# Altium footprint library MC1.PcbLib: 70 footprints (part 3 of 5)
Each footprint in its own frame and in the unit in brackets; x right, y up, seen from the top. Pads: shape width x height; smd on the part's side, far side on the other; paste and mask are expansions set on the pad; w line width, h text height; cw(c..) or ccw(c..) is an arc to the next point about the centre after c.
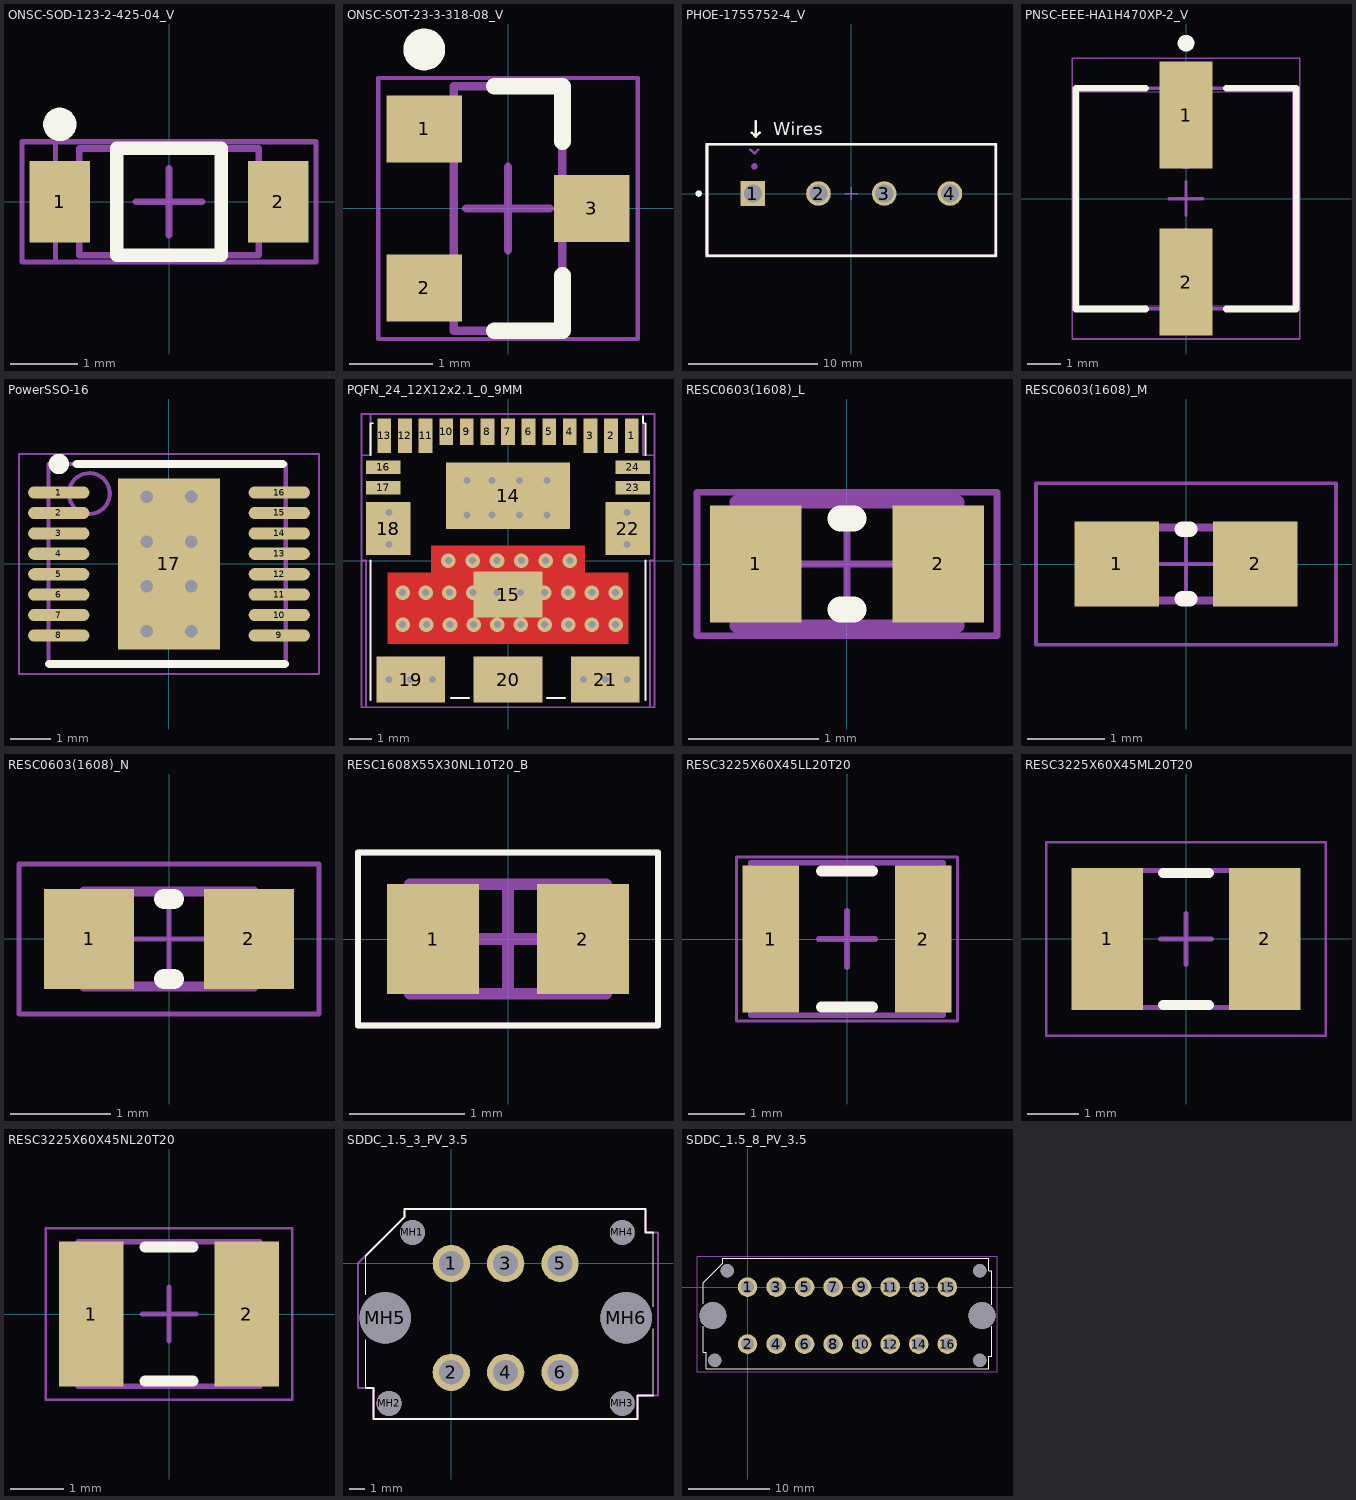
[diagram p2: the footprints below, top view; thin cyan lines are the x and y axes]

## ONSC-SOD-123-2-425-04_V [mm] "SOD, 2-Leads, Body 2.69x1.6mm"
height 1.35
pads (2):
  rect 0.91x1.22 smd: 1(-1.635,0) 2(1.635,0)
Top Overlay:
  circle w0.25: c-1.635,1.16 r0.125
  lines w0.2: -0.78,-0.8 0.78,-0.8 0.78,0.8 -0.78,0.8 -0.78,-0.8
Top Courtyard:
  lines w0.05: -2.19,-0.9 2.19,-0.9 2.19,0.9 -2.19,0.9 -2.19,-0.9
  lines w0.1: -0.5,0 0.5,0 ; 0,-0.5 0,0.5
Mechanical 13:
  lines w0.1: -1.345,-0.8 1.345,-0.8 1.345,0.8 -1.345,0.8 -1.345,-0.8
Mechanical 15:
  lines w0.05: -2.19,-0.9 2.19,-0.9 2.19,0.9 -2.19,0.9 -2.19,-0.9
  lines w0.1: -0.5,0 0.5,0 ; 0,-0.5 0,0.5
Top Assembly (Mech29):
  lines w0.076: -1.7,0.9 -1.7,-0.9 -2.2,-0.9 ; -2.2,-0.9 -2.2,0.9 2.2,0.9 2.2,-0.9 -2.2,-0.9
  text "'.Designator'" at -2.878,-0.212 h0.51
3D body: height 1.35, standoff 0, extent -1.345,-0.8 1.345,0.8

## ONSC-SOT-23-3-318-08_V [mm] "SOT23, 3-Leads, Body 2.92x1.3mm, Pitch 0.95mm"
height 1.11
pads (3):
  rect 0.9x0.8 smd: 1(-1,0.95) 2(-1,-0.95) 3(1,0)
Top Overlay:
  circle w0.25: c-1,1.9 r0.125
  lines w0.2: -0.165,-1.46 0.65,-1.46 0.65,-0.8 ; -0.165,1.46 0.65,1.46 0.65,0.8
Top Courtyard:
  lines w0.05: -1.55,-1.56 -1.55,1.56 1.55,1.56 1.55,-1.56 -1.55,-1.56
  lines w0.1: -0.5,0 0.5,0 ; 0,-0.5 0,0.5
Mechanical 13:
  lines w0.1: -0.65,-1.46 -0.65,1.46 0.65,1.46 0.65,-1.46 -0.65,-1.46
Mechanical 15:
  lines w0.05: -1.55,-1.56 -1.55,1.56 1.55,1.56 1.55,-1.56 -1.55,-1.56
  lines w0.1: -0.5,0 0.5,0 ; 0,-0.5 0,0.5
Top Assembly (Mech29):
  circle w0.254: c-1,1 r0.141
  lines w0.05: -1.55,-1.56 -1.55,1.56 1.55,1.56 1.55,-1.56 -1.55,-1.56
  text "'.Designator'" at -0.212,2.878 h0.51
3D body: height 1.11, standoff 0.01, extent -0.65,-1.46 0.65,1.46

## PHOE-1755752-4_V [mm] "TH, 4-Leads, Body 21.32x8.6mm, Pitch 5.08mm"
height 12
pads (4):
  rect 1.9x1.9 hole 1.4: 1(-7.62,0)
  round 1.9 hole 1.4: 2(-2.54,0) 3(2.54,0) 4(7.62,0)
Top Overlay:
  circle w0.25: c-11.81,0 r0.125
  lines w0.2: -7.7,4.7 -7.4,4.4 ; -7.4,5.6 -7.4,4.4 ; -7.1,4.7 -7.4,4.4 ; -11.16,-4.8 11.16,-4.8 11.16,3.8 -11.16,3.8 -11.16,-4.8
  text "Wires" at -6.049,4.5 h1
Mechanical 13:
  lines w0.1: -11.16,-4.8 11.16,-4.8 11.16,3.8 -11.16,3.8 -11.16,-4.8
Mechanical 15:
  lines w0.05: -11.26,-4.9 11.26,-4.9 11.26,3.9 -11.26,3.9 -11.26,-4.9
  lines w0.1: -0.5,0 0.5,0 ; 0,-0.5 0,0.5
Top Assembly (Mech29):
  circle w0.25: c-7.5,2.1 r0.125
  lines w0.2: -7.8,3.4 -7.5,3.1 -7.2,3.4 ; -11.16,-4.8 11.16,-4.8 11.16,3.8 -11.16,3.8 -11.16,-4.8
  text "'.Designator'" at -5.665,-0.417 h1
3D body "1792773.stp": height 29.7, standoff 3.7, extent -10.16,-6.185 10.16,6.415
3D body "1755752.stp": height 12.01, standoff -3.89, extent -11.165,-4.805 11.155,3.795

## PLUG_1792799 [mm] "PLUG_1792799"
3D body "1792799 .stp": height 26.01, standoff 0.01, extent -15.34,-10.13 15.14,2.47

## PNSC-EEE-HA1H470XP-2_V [mm] "SMD, 2-Leads, Body 6.6x6.6mm, Height 8mm"
height 8
pads (2):
  rect 1.6x3.2 smd: 1(0,2.5) 2(0,-2.5)
Top Overlay:
  circle w0.25: c0,4.65 r0.125
  lines w0.2: -1.2,-3.3 -3.3,-3.3 -3.3,3.3 -1.2,3.3 ; 1.2,-3.3 3.3,-3.3 3.3,3.3 1.2,3.3
Top Courtyard:
  lines w0.05: -3.4,-4.2 -3.4,4.2 3.4,4.2 3.4,-4.2 -3.4,-4.2
  lines w0.1: -0.5,0 0.5,0 ; 0,-0.5 0,0.5
Mechanical 13:
  lines w0.005: -3.3,-3.2 3.3,-3.2 ; -3.3,3.2 3.3,3.2 ; -3.2,-3.2 -3.2,3.2 ; -0.325,-1.225 cw(c0,-1.225) 0.325,-1.225 ; 3.2,-3.2 3.2,3.2 ; -0.325,1.225 ccw(c0,1.225) 0.325,1.225 -0.325,1.225
  lines w0.1: -3.3,-3.3 -3.3,3.3 3.3,3.3 3.3,-3.3 -3.3,-3.3
Mechanical 15:
  lines w0.05: -3.4,-4.2 -3.4,4.2 3.4,4.2 3.4,-4.2 -3.4,-4.2
  lines w0.1: -0.5,0 0.5,0 ; 0,-0.5 0,0.5
Top Assembly (Mech29):
  lines w0.05: -3.4,-4.2 -3.4,4.2 3.4,4.2 3.4,-4.2 -3.4,-4.2
  lines w0.1: -0.5,3.4 0.5,3.4 ; 0,2.9 0,3.9
  text "'.Designator'" at -2.878,-0.212 h0.51
3D body: height 8, standoff 2.3, extent -3.157,-1.891 3.157,3.15
3D body: height 8, standoff 2.3, extent -2.528,-3.151 2.528,-1.88
3D body: height 2.3, standoff 1.8, extent -2.799,-2.799 2.8,2.799
3D body: height 1.8, standoff 0.3, extent -3.15,-3.149 3.149,3.149
3D body: height 0.5, standoff 0.3, extent -3.3,-1.2 -3.2,1.2
3D body: height 0.5, standoff 0.3, extent 3.2,-1.2 3.3,1.2
3D body: height 1, standoff 0.3, extent -3.3,-3.3 3.3,-1.2
3D body: height 1.3, standoff 0.3, extent -3.3,1.2 3.3,3.3
3D body: height 0.3, standoff 0.1, extent -3.3,-3.3 3.3,3.3
3D body: height 0.1, standoff 0, extent -0.325,-1.225 0.326,-0.899
3D body: height 0.1, standoff 0, extent -0.326,0.899 0.326,1.226
3D body: height 0.1, standoff 0, extent -0.325,1.226 0.325,3.65
3D body: height 0.1, standoff 0, extent -0.325,-3.65 0.325,-1.225

## PowerSSO-16 [mm] "SSOP, 16-Leads, Body 4.90x3.90mm, Pitch 0.50mm, Thermal Pad 4.20x2.50mm, IPC Medium Density"
height 1.7
pads (17):
  oval 1.5x0.3 smd: 1(-2.7,1.75) 2(-2.7,1.25) 3(-2.7,0.75) 4(-2.7,0.25) 5(-2.7,-0.25) 6(-2.7,-0.75) 7(-2.7,-1.25) 8(-2.7,-1.75) 9(2.7,-1.75) 10(2.7,-1.25) 11(2.7,-0.75) 12(2.7,-0.25) 13(2.7,0.25) 14(2.7,0.75) 15(2.7,1.25) 16(2.7,1.75)
  rect 2.5x4.2 smd: 17(0,0)
via -0.55,1.65 diameter 0.635 hole 0.305
via 0.55,1.65 diameter 0.635 hole 0.305
via -0.55,0.55 diameter 0.635 hole 0.305
via 0.55,0.55 diameter 0.635 hole 0.305
via -0.55,-0.55 diameter 0.635 hole 0.305
via 0.55,-0.55 diameter 0.635 hole 0.305
via -0.55,-1.65 diameter 0.635 hole 0.305
via 0.55,-1.65 diameter 0.635 hole 0.305
Top Overlay:
  circle w0.25: c-2.7,2.45 r0.125
  lines w0.2: -2.936,-2.45 2.837,-2.45 ; -2.262,2.45 2.785,2.45
Top Courtyard:
  lines w0.05: -3.675,-2.7 -3.675,2.7 3.675,2.7 3.675,-2.7 -3.675,-2.7
  lines w0.1: -0.5,0 0.5,0 ; 0,-0.5 0,0.5
Top Assembly (Mech29):
  circle w0.1: c-1.952,1.726 r0.5
  lines w0.1: -2.951,-2.45 -2.951,2.45 2.861,2.45 2.861,-2.45 -2.951,-2.45
  text "'.Designator'" at -2.878,-0.212 h0.51
3D body "PowerSSO-16.step": height 1.7, standoff 0, extent -3,-2.45 3,2.45

## PQFN_24_12X12x2.1_0_9MM [mm]
pads (24):
  rect 0.6x1.5 smd paste+0 mask+0.102: 1(5.4,5.45) 2(4.5,5.45) 3(3.6,5.45) 11(-3.6,5.45) 12(-4.5,5.45) 13(-5.4,5.45)
  rect 0.6x1.15 smd paste+0 mask+0.102: 4(2.7,5.625) 5(1.8,5.625) 6(0.9,5.625) 7(0,5.625) 8(-0.9,5.625) 9(-1.8,5.625) 10(-2.7,5.625)
  rect 5.4x2.9 smd paste-10 mask+0.102: 14(0,2.832)
  rect 3x2 smd paste-10 mask+0.102: 15(0,-1.485)
  rect 1.5x0.6 smd paste+0 mask+0.102: 16(-5.45,4.075) 17(-5.45,3.175) 23(5.45,3.175) 24(5.45,4.075)
  rect 1.95x2.3 smd paste+0 mask+0.102: 18(-5.225,1.4) 22(5.225,1.4)
  rect 3x2 smd paste+0 mask+0.102: 19(-4.25,-5.2) 20(0,-5.2) 21(4.25,-5.2)
via -0.467,-2.8 diameter 0.635 hole 0.305
via -0.488,-1.4 diameter 0.635 hole 0.305
via -4.6,-2.8 diameter 0.635 hole 0.305
via -4.6,-1.4 diameter 0.635 hole 0.305
via -0.48,0 diameter 0.635 hole 0.305
via 1.7,3.5 diameter 0.635 hole 0.305
via 1.7,2 diameter 0.635 hole 0.305
via -1.8,3.5 diameter 0.635 hole 0.305
via -1.8,2 diameter 0.635 hole 0.305
via -4.25,-5.2 diameter 0.635 hole 0.305
via -3.3,-5.2 diameter 0.635 hole 0.305
via -5.2,-5.2 diameter 0.635 hole 0.305
via 4.25,-5.2 diameter 0.635 hole 0.305
via 5.2,-5.2 diameter 0.635 hole 0.305
via 3.3,-5.2 diameter 0.635 hole 0.305
via -0.7,3.5 diameter 0.635 hole 0.305
via -0.7,2 diameter 0.635 hole 0.305
via 0.5,3.5 diameter 0.635 hole 0.305
via 0.5,2 diameter 0.635 hole 0.305
via -3.567,-2.8 diameter 0.635 hole 0.305
via -3.6,-1.4 diameter 0.635 hole 0.305
via 3.667,-2.8 diameter 0.635 hole 0.305
via 3.662,-1.4 diameter 0.635 hole 0.305
via 4.7,-2.8 diameter 0.635 hole 0.305
via 4.7,-1.4 diameter 0.635 hole 0.305
via -1.5,-2.8 diameter 0.635 hole 0.305
via -1.525,-1.4 diameter 0.635 hole 0.305
via -1.54,0 diameter 0.635 hole 0.305
via -2.533,-2.8 diameter 0.635 hole 0.305
via -2.563,-1.4 diameter 0.635 hole 0.305
via -2.6,0 diameter 0.635 hole 0.305
via 0.567,-2.8 diameter 0.635 hole 0.305
via 0.55,-1.4 diameter 0.635 hole 0.305
via 0.58,0 diameter 0.635 hole 0.305
via 1.6,-2.8 diameter 0.635 hole 0.305
via 1.587,-1.4 diameter 0.635 hole 0.305
via 1.64,0 diameter 0.635 hole 0.305
via 2.633,-2.8 diameter 0.635 hole 0.305
via 2.625,-1.4 diameter 0.635 hole 0.305
via 2.7,0 diameter 0.635 hole 0.305
via -5.2,0.7 diameter 0.635 hole 0.305
via -5.2,2.1 diameter 0.635 hole 0.305
via 5.2,0.7 diameter 0.635 hole 0.305
via 5.2,2.1 diameter 0.635 hole 0.305
Top Layer:
  region: -3.29,0.3
  region: -3.35,0.655 -3.35,-0.525 -5.25,-0.525 -5.25,-3.625 5.25,-3.625 5.25,-0.525 3.35,-0.525 3.35,0.655
Top Overlay:
  lines w0.076: -6,-6.1 -6,0 ; -6,4.6 -6,6 -5.9,6 ; -2.5,-6 -1.7,-6 ; 1.7,-6 2.5,-6 ; 5.9,6.3 5.9,6 6,6 6,4.6 ; 6,-6.1 6,0
Top Paste:
  region: -1.03,0.565 -1.03,-0.565 1.03,-0.565 1.03,0.565
  region: -3.29,0.565 -3.29,-0.565 -1.23,-0.565 -1.23,0.565
  region: 1.23,0.565 1.23,-0.565 3.29,-0.565 3.29,0.565
  region: -1.03,-0.726 -1.03,-2.05 1.03,-2.05 1.03,-0.726
  region: -3.29,-0.726 -3.29,-2.05 -1.23,-2.05 -1.23,-0.726
  region: 1.23,-0.726 1.23,-2.05 3.29,-2.05 3.29,-0.726
  region: -3.29,-2.225 -3.29,-3.55 -1.23,-3.55 -1.23,-2.225
  region: -1.03,-2.225 -1.03,-3.55 1.03,-3.55 1.03,-2.225
  region: 1.23,-2.225 1.23,-3.55 3.29,-3.55 3.29,-2.225
  region: -5.15,-0.726 -5.15,-2.05 -3.49,-2.05 -3.49,-0.726
  region: -5.15,-2.225 -5.15,-3.55 -3.49,-3.55 -3.49,-2.225
  region: 3.49,-0.726 3.49,-2.05 5.15,-2.05 5.15,-0.726
  region: 3.49,-2.225 3.49,-3.55 5.15,-3.55 5.15,-2.225
  region: -0.85,4.232 -0.85,2.932 0.85,2.932 0.85,4.232
  region: -0.85,2.732 -0.85,1.432 0.85,1.432 0.85,2.732
  region: -2.575,4.232 -2.575,2.932 -1.025,2.932 -1.025,4.232
  region: -2.575,2.732 -2.575,1.432 -1.025,1.432 -1.025,2.732
  region: 1.025,4.232 1.025,2.932 2.575,2.932 2.575,4.232
  region: 1.025,2.732 1.025,1.432 2.575,1.432 2.575,2.732
Top Courtyard:
  lines w0.076: -6.4,0 -6.2,0 -6.2,-6.4 6.2,-6.4 6.2,-5.8 6.2,0 6.4,0 6.4,4.6 5.9,4.6 5.9,6.4 -6,6.4 -6,4.6 -6.4,4.6 -6.4,0
Top Assembly (Mech29):
  circle w0.254: c5.4,5.5 r0.1
  lines w0.076: -6.4,-6.4 -6.4,6.4 ; -6.4,-6.4 6.4,-6.4 ; -6.4,-6.4 -6.4,6.4 ; -6.4,-6.4 6.4,-6.4 ; -6.4,6.4 6.4,6.4 ; -6.4,6.4 6.4,6.4 ; 6.4,-6.4 6.4,6.4 ; 6.4,-6.4 6.4,6.4
  text "'.Designator'" at -5.665,-0.417 h1
3D body: height 2.25, standoff 0.1, extent 4.303,4.601 5.1,5.399
3D body: height 10, standoff 0.25, extent 7.8,4.6 7.8,4.6
3D body: height 2.2, standoff 0, extent -6,-6 6,6

## RESC0603(1608)_L [mm] "Chip Resistor, Body 1.6x0.8mm, IPC High Density"
height 0.6
pads (2):
  rect 0.7x0.9 smd: 1(-0.7,0) 2(0.7,0)
Top Overlay:
  lines w0.2: -0.05,-0.35 0.05,-0.35 ; -0.05,0.35 0.05,0.35
Top Courtyard:
  lines w0.05: -0.475,0 0.475,0 ; 0,-0.475 0,0.475 ; -1.15,-0.55 -1.15,0.55 1.15,0.55 1.15,-0.55 -1.15,-0.55
Mechanical 13:
  lines w0.1: -0.85,-0.475 -0.85,0.475 0.85,0.475 0.85,-0.475 -0.85,-0.475
Mechanical 15:
  lines w0.05: -0.475,0 0.475,0 ; 0,-0.475 0,0.475 ; -1.15,-0.55 -1.15,0.55 1.15,0.55 1.15,-0.55 -1.15,-0.55
Top Assembly (Mech29):
  lines w0.05: -1.15,-0.55 -1.15,0.55 1.15,0.55 1.15,-0.55 -1.15,-0.55
  text "'.Designator'" at -2.878,-0.212 h0.51
3D body: height 0.6, standoff 0, extent 0.581,-0.474 0.85,0.475
3D body: height 0.6, standoff 0, extent -0.58,-0.474 0.581,0.475
3D body: height 0.6, standoff 0, extent -0.849,-0.474 -0.58,0.475

## RESC0603(1608)_M [mm] "Chip Resistor, Body 1.6x0.8mm, IPC Low Density"
height 0.6
pads (2):
  rect 1.1x1.1 smd: 1(-0.9,0) 2(0.9,0)
Top Overlay:
  lines w0.2: -0.05,-0.45 0.05,-0.45 ; -0.05,0.45 0.05,0.45
Top Courtyard:
  lines w0.05: -0.475,0 0.475,0 ; 0,-0.475 0,0.475 ; -1.95,-1.05 -1.95,1.05 1.95,1.05 1.95,-1.05 -1.95,-1.05
Mechanical 13:
  lines w0.1: -0.85,-0.475 -0.85,0.475 0.85,0.475 0.85,-0.475 -0.85,-0.475
Mechanical 15:
  lines w0.05: -0.475,0 0.475,0 ; 0,-0.475 0,0.475 ; -1.95,-1.05 -1.95,1.05 1.95,1.05 1.95,-1.05 -1.95,-1.05
Top Assembly (Mech29):
  lines w0.05: -1.95,-1.05 -1.95,1.05 1.95,1.05 1.95,-1.05 -1.95,-1.05
  text "'.Designator'" at -2.878,-0.212 h0.51
3D body: height 0.6, standoff 0, extent -0.849,-0.474 -0.58,0.475
3D body: height 0.6, standoff 0, extent -0.58,-0.474 0.581,0.475
3D body: height 0.6, standoff 0, extent 0.581,-0.474 0.85,0.475

## RESC0603(1608)_N [mm] "Chip Resistor, Body 1.6x0.8mm, IPC Medium Density"
height 0.6
pads (2):
  rect 0.9x1 smd: 1(-0.8,0) 2(0.8,0)
Top Overlay:
  lines w0.2: -0.05,-0.4 0.05,-0.4 ; -0.05,0.4 0.05,0.4
Top Courtyard:
  lines w0.05: -0.475,0 0.475,0 ; 0,-0.475 0,0.475 ; -1.5,-0.75 -1.5,0.75 1.5,0.75 1.5,-0.75 -1.5,-0.75
Mechanical 13:
  lines w0.1: -0.85,-0.475 -0.85,0.475 0.85,0.475 0.85,-0.475 -0.85,-0.475
Mechanical 15:
  lines w0.05: -0.475,0 0.475,0 ; 0,-0.475 0,0.475 ; -1.5,-0.75 -1.5,0.75 1.5,0.75 1.5,-0.75 -1.5,-0.75
Top Assembly (Mech29):
  lines w0.05: -1.5,-0.75 -1.5,0.75 1.5,0.75 1.5,-0.75 -1.5,-0.75
  text "'.Designator'" at -2.878,-0.212 h0.51
3D body: height 0.6, standoff 0, extent 0.581,-0.474 0.85,0.475
3D body: height 0.6, standoff 0, extent -0.58,-0.474 0.581,0.475
3D body: height 0.6, standoff 0, extent -0.849,-0.474 -0.58,0.475

## RESC1608X55X30NL10T20_B [mm] "Chip Resistor, 2-Leads, Body 1.7x0.95mm, IPC Medium Density"
height 0.55
pads (2):
  rect 0.8x0.95 smd: 1(-0.65,0) 2(0.65,0)
Top Overlay:
  lines w0.05: -1.3,-0.75 -1.3,0.75 1.3,0.75 1.3,-0.75 -1.3,-0.75
Mechanical 13:
  lines w0.1: -0.85,-0.475 -0.85,0.475 0.85,0.475 0.85,-0.475 -0.85,-0.475
Mechanical 15:
  lines w0.05: -1.3,-0.75 -1.3,0.75 1.3,0.75 1.3,-0.75 -1.3,-0.75
  lines w0.1: -0.475,0 0.475,0 ; 0,-0.475 0,0.475
Top Assembly (Mech29):
  lines w0.05: -1.3,-0.75 -1.3,0.75 1.3,0.75 1.3,-0.75 -1.3,-0.75
  text "'.Designator'" at -3.965,-0.292 h0.7
3D body "RESC1608X06N.step": height 0.55, standoff 0, extent -0.85,-0.475 0.85,0.475

## RESC3225X60X45LL20T20 [mm] "Chip Resistor, 2-Leads, Body 3.20x2.50mm, IPC High Density"
height 0.6
pads (2):
  rect 1x2.6 smd: 1(-1.35,0) 2(1.35,0)
Top Overlay:
  lines w0.2: -0.45,-1.2 0.45,-1.2 ; -0.45,1.2 0.45,1.2
Top Courtyard:
  lines w0.05: -1.95,-1.45 -1.95,1.45 1.95,1.45 1.95,-1.45 -1.95,-1.45
  lines w0.1: -0.5,0 0.5,0 ; 0,-0.5 0,0.5
Mechanical 13:
  lines w0.1: -1.7,-1.35 -1.7,1.35 1.7,1.35 1.7,-1.35 -1.7,-1.35
Mechanical 15:
  lines w0.05: -1.95,-1.45 -1.95,1.45 1.95,1.45 1.95,-1.45 -1.95,-1.45
  lines w0.1: -0.5,0 0.5,0 ; 0,-0.5 0,0.5
Top Assembly (Mech29):
  lines w0.05: -1.95,-1.45 -1.95,1.45 1.95,1.45 1.95,-1.45 -1.95,-1.45
  text "'.Designator'" at -2.878,-0.212 h0.51
3D body: height 0.6, standoff 0, extent -1.25,-1.35 1.25,1.35
3D body: height 0.6, standoff 0, extent -1.7,-1.35 -1.25,1.35
3D body: height 0.6, standoff 0, extent 1.25,-1.35 1.7,1.35

## RESC3225X60X45ML20T20 [mm] "Chip Resistor, 2-Leads, Body 3.20x2.50mm, IPC Low Density"
height 0.6
pads (2):
  rect 1.4x2.8 smd: 1(-1.55,0) 2(1.55,0)
Top Overlay:
  lines w0.2: -0.45,-1.3 0.45,-1.3 ; -0.45,1.3 0.45,1.3
Top Courtyard:
  lines w0.05: -2.75,-1.9 2.75,-1.9 2.75,1.9 -2.75,1.9 -2.75,-1.9
  lines w0.1: -0.5,0 0.5,0 ; 0,-0.5 0,0.5
Mechanical 13:
  lines w0.1: -1.7,-1.35 1.7,-1.35 1.7,1.35 -1.7,1.35 -1.7,-1.35
Mechanical 15:
  lines w0.05: -2.75,-1.9 2.75,-1.9 2.75,1.9 -2.75,1.9 -2.75,-1.9
  lines w0.1: -0.5,0 0.5,0 ; 0,-0.5 0,0.5
Top Assembly (Mech29):
  lines w0.05: -2.75,-1.9 2.75,-1.9 2.75,1.9 -2.75,1.9 -2.75,-1.9
  text "'.Designator'" at -2.878,-0.212 h0.51
3D body: height 0.6, standoff 0, extent 1.25,-1.35 1.7,1.35
3D body: height 0.6, standoff 0, extent -1.7,-1.35 -1.25,1.35
3D body: height 0.6, standoff 0, extent -1.25,-1.35 1.25,1.35

## RESC3225X60X45NL20T20 [mm] "Chip Resistor, 2-Leads, Body 3.20x2.50mm, IPC Medium Density"
height 0.6
pads (2):
  rect 1.2x2.7 smd: 1(-1.45,0) 2(1.45,0)
Top Overlay:
  lines w0.2: -0.45,-1.25 0.45,-1.25 ; -0.45,1.25 0.45,1.25
Top Courtyard:
  lines w0.05: -2.3,-1.6 2.3,-1.6 2.3,1.6 -2.3,1.6 -2.3,-1.6
  lines w0.1: -0.5,0 0.5,0 ; 0,-0.5 0,0.5
Mechanical 13:
  lines w0.1: -1.7,-1.35 1.7,-1.35 1.7,1.35 -1.7,1.35 -1.7,-1.35
Mechanical 15:
  lines w0.05: -2.3,-1.6 2.3,-1.6 2.3,1.6 -2.3,1.6 -2.3,-1.6
  lines w0.1: -0.5,0 0.5,0 ; 0,-0.5 0,0.5
Top Assembly (Mech29):
  lines w0.05: -2.3,-1.6 2.3,-1.6 2.3,1.6 -2.3,1.6 -2.3,-1.6
  text "'.Designator'" at -2.878,-0.212 h0.51
3D body: height 0.6, standoff 0, extent 1.25,-1.35 1.7,1.35
3D body: height 0.6, standoff 0, extent -1.7,-1.35 -1.25,1.35
3D body: height 0.6, standoff 0, extent -1.25,-1.35 1.25,1.35

## SDDC_1.5_3_PV_3.5 [mm]
pads (12):
  round 2.4 hole 1.6: 1(0,0) 2(0,-7) 3(3.5,0) 4(3.5,-7) 5(7,0) 6(7,-7)
  round 1.6 hole 1.6 unplated: MH1(-2.5,2) MH2(-4,-9) MH3(11,-9) MH4(11,2)
  round 3.3 hole 3.3 unplated: MH5(-4.25,-3.5) MH6(11.25,-3.5)
Top Overlay:
  lines w0.076: -5.5,-8 -5.5,-4.9 ; -5.5,-2 -5.5,0.5 ; 12.99,-8.5 12.99,-4.21 ; 12.99,-2.79 12.99,2
  lines w0.127: -5.5,-8 -5,-8 -5,-10 11.99,-10 11.99,-8.5 12.99,-8.5 ; -5.5,0.5 -3,3 -3,3.5 12.49,3.5 12.49,2 12.99,2
Top Courtyard:
  lines w0.127: -6,-8 -6,0 -3,3 -3,3.5 12.49,3.5 12.49,2 13.3,2 13.3,-8.5 11.99,-8.5 11.99,-10 -5,-10 -5,-8 -6,-8
3D body "1848655.stp": height 14.1, standoff -3.5, extent -5.9,-10.25 12.9,3.25

## SDDC_1.5_8_PV_3.5 [mm]
pads (22):
  round 2.4 hole 1.6: 1(0,0) 2(0,-7) 3(3.5,0) 4(3.5,-7) 5(7,0) 6(7,-7) 7(10.5,0) 8(10.5,-7) 9(14,0) 10(14,-7) 11(17.5,0) 12(17.5,-7) 13(21,0) 14(21,-7) 15(24.5,0) 16(24.5,-7)
  round 3.3 hole 3.3 unplated: ""(-4.25,-3.5) ""(28.75,-3.5)
  round 1.6 hole 1.65 unplated: ""(-4,-9) ""(-2.5,2) ""(28.5,-9) ""(28.5,2)
Top Overlay:
  lines w0.076: -5.461,-4.826 -5.461,-8.001 -5.08,-8.001 -5.08,-10.033 29.591,-10.033 29.591,-8.509 29.972,-8.509 29.972,-4.826 ; -5.461,-2.032 -5.461,0.508 -3.048,2.921 -3.048,3.556 29.591,3.556 29.591,2.032 29.972,2.032 29.972,-2.159
Top Courtyard:
  lines w0.076: -6.2,-10.4 -6.2,3.8 30.6,3.8 30.6,-10.4 30.5,-10.4 -6.2,-10.4
3D body "1848707.stp": height 14.1, standoff -3.5, extent -5.9,-10.25 30.4,3.25